# Altium footprint library hphonglib.PcbLib: 703 footprints (part 34 of 44)
Each footprint in its own frame and in the unit in brackets; x right, y up, seen from the top. Pads: shape width x height; smd on the part's side, far side on the other; paste and mask are expansions set on the pad; w line width, h text height; cw(c..) or ccw(c..) is an arc to the next point about the centre after c.
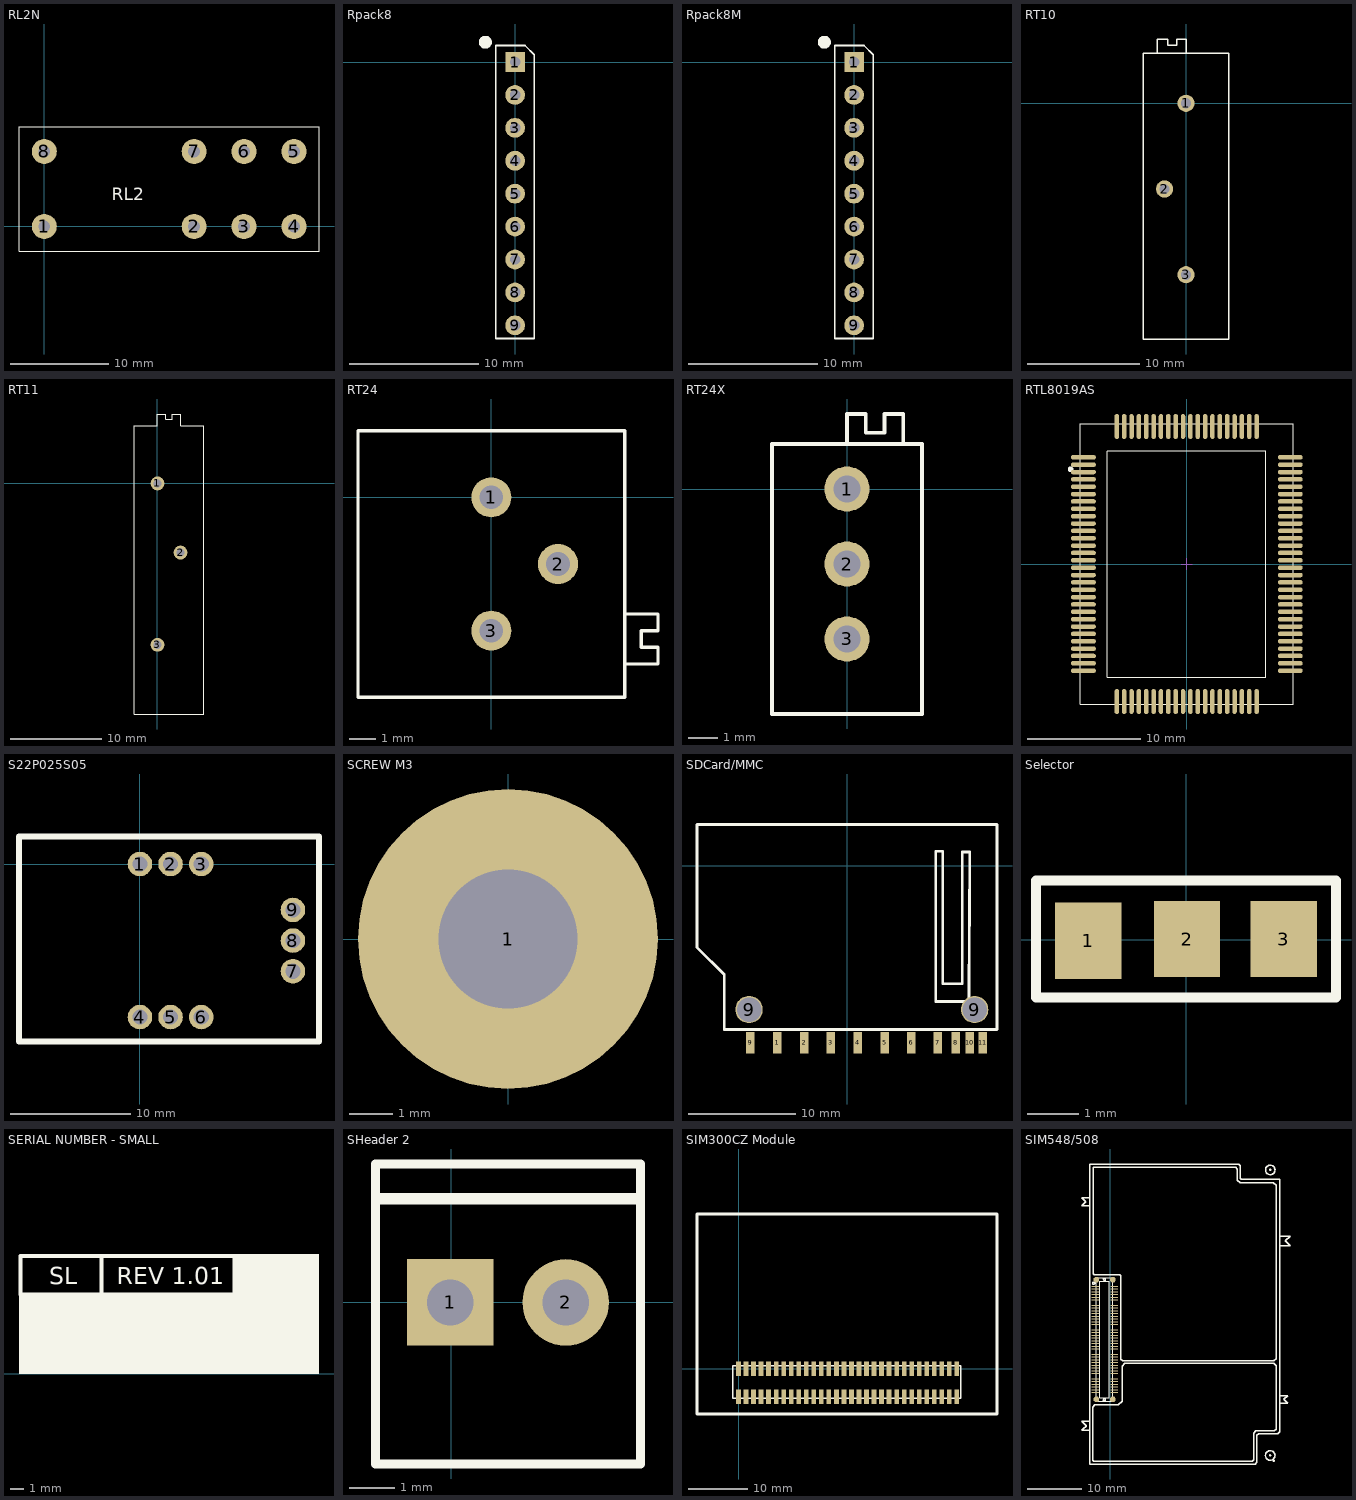
[diagram p33: the footprints below, top view; thin cyan lines are the x and y axes]

## RL2N [mm] "Relè body 29x12mm - 2 way - FEME"
pads (8):
  round 2.54 hole 1.2: 1(0,0) 2(15.24,0) 3(20.32,0) 4(25.4,0) 5(25.4,7.62) 6(20.32,7.62) 7(15.24,7.62) 8(0,7.62)
Top Overlay:
  lines w0.127: -2.54,-2.54 27.94,-2.54 27.94,10.16 -2.54,10.16 -2.54,-2.54
  text "RL2" at 6.858,2.667 h1.27
Bottom Overlay:
  lines w0.254: -2.575,-2.55 -2.575,10.125 27.925,10.125 27.925,-2.55 -2.575,-2.55
3D body: height 20.9, standoff -3.99, extent -1.941,-2.465 27.559,10.035

## Rpack8 [mil]
pads (9):
  rect 60x60 hole 31.5 unplated: 1(0,0)
  round 60 hole 31.5 unplated: 2(0,-100) 3(0,-200) 4(0,-300) 5(0,-400) 6(0,-500) 7(0,-600) 8(0,-700) 9(0,-800)
Top Overlay:
  circle w19.68: c-90.55,60.04 r9.84
  lines w5: -59.06,-840 -59.06,50 30,50 58.07,21.93 58.07,-840 -59.06,-840
Bottom Overlay:
  circle w19.68: c-91.54,57.09 r9.84
  lines w10: -57.09,-841.54 -57.09,50.2 58.07,50.2 58.07,-841.54 -57.09,-841.54
3D body: height 137.8, standoff 0.39, extent -5.25,-10 5,10.09
3D body: height 39.37, standoff 0.39, extent -5.66,-29.53 4.68,29.65
3D body: height 39.37, standoff 0.39, extent -5.66,-129.53 4.68,-70.35
3D body: height 137.8, standoff 0.39, extent -5.25,-110 5,-89.91
3D body: height 39.37, standoff 0.39, extent -5.66,-229.53 4.68,-170.35
3D body: height 137.8, standoff 0.39, extent -5.25,-210 5,-189.91
3D body: height 39.37, standoff 0.39, extent -5.66,-329.53 4.68,-270.35
3D body: height 137.8, standoff 0.39, extent -5.25,-310 5,-289.91
3D body: height 39.37, standoff 0.39, extent -5.66,-429.53 4.68,-370.35
3D body: height 137.8, standoff 0.39, extent -5.25,-410 5,-389.91
3D body: height 39.37, standoff 0.39, extent -5.66,-529.53 4.68,-470.35
3D body: height 137.8, standoff 0.39, extent -5.25,-510 5,-489.91
3D body: height 39.37, standoff 0.39, extent -5.66,-629.53 4.68,-570.35
3D body: height 137.8, standoff 0.39, extent -5.25,-610 5,-589.91
3D body: height 39.37, standoff 0.39, extent -5.66,-729.53 4.68,-670.35
3D body: height 137.8, standoff 0.39, extent -5.25,-710 5,-689.91
3D body: height 39.37, standoff 0.39, extent -5.66,-829.53 4.68,-770.35
3D body: height 137.8, standoff 0.39, extent -5.25,-810 5,-789.91
3D body: height 200.79, standoff 39.37, extent -49.47,-840 48.61,39.62

## Rpack8M [mil]
pads (9):
  rect 60x60 hole 31.5 unplated: 1(0,0)
  round 60 hole 31.5 unplated: 2(0,-100) 3(0,-200) 4(0,-300) 5(0,-400) 6(0,-500) 7(0,-600) 8(0,-700) 9(0,-800)
Top Overlay:
  circle w19.68: c-90.55,60.04 r9.84
  lines w5: -59.06,-840 -59.06,50 30,50 58.07,21.93 58.07,-840 -59.06,-840
Bottom Overlay:
  circle w19.68: c-91.54,57.09 r9.84
  lines w10: -57.09,-841.54 -57.09,50.2 58.07,50.2 58.07,-841.54 -57.09,-841.54
3D body: height 248.03, standoff -86.61, extent -24.61,-844.83 24.61,41

## RT10 [mil]
pads (3):
  round 60 hole 35.43 unplated: 1(0,0) 2(-75,-300) 3(0,-600)
Top Overlay:
  lines w5: -100,175 -100,225 -64,225 -64,203 -32,203 -32,225 0,225 0,175 ; -150,-825 150,-825 150,175 -150,175 -150,-825

## RT11 [mil]
pads (3):
  round 60 hole 35.43 unplated: 1(0,0) 2(100,-300) 3(0,-700)
Top Overlay:
  lines w5: 0,300 0,250 -100,250 -100,-1000 200,-1000 200,250 100,250 100,300 64,300 64,279 36,279 36,301 0,301

## RT24 [mil]
pads (3):
  round 60 hole 35.43 unplated: 1(0,0) 2(100,-100) 3(0,-200)
Top Overlay:
  lines w5: 200,-250 250,-250 250,-225 225,-225 225,-200 250,-200 250,-175 200,-175 ; -200,-300 -200,100 200,100 200,-300 -200,-300

## RT24X [mil]
pads (3):
  round 60 hole 35.43 unplated: 1(0,0) 2(0,-100) 3(0,-200)
Top Overlay:
  lines w5: 0,60 0,100 25,100 25,75 50,75 50,100 75,100 75,60 ; -100,-300 100,-300 100,60 -100,60 -100,-300

## RTL8019AS [mm] "100-Pin Ceramic Quad Flat Pack 0.635 mm Pitch, IPC Medium Density"
height 3.2
pads (100):
  oval 2.2x0.4 smd: 1(-9.125,9.425) 2(-9.125,8.775) 3(-9.125,8.125) 4(-9.125,7.475) 5(-9.125,6.825) 6(-9.125,6.175) 7(-9.125,5.525) 8(-9.125,4.875) 9(-9.125,4.225) 10(-9.125,3.575) 11(-9.125,2.925) 12(-9.125,2.275) 13(-9.125,1.625) 14(-9.125,0.975) 15(-9.125,0.325) 16(-9.125,-0.325) 17(-9.125,-0.975) 18(-9.125,-1.625) 19(-9.125,-2.275) 20(-9.125,-2.925) 21(-9.125,-3.575) 22(-9.125,-4.225) 23(-9.125,-4.875) 24(-9.125,-5.525) 25(-9.125,-6.175) 26(-9.125,-6.825) 27(-9.125,-7.475) 28(-9.125,-8.125) 29(-9.125,-8.775) 30(-9.125,-9.425) 51(9.15,-9.425) 52(9.15,-8.775) 53(9.15,-8.125) 54(9.15,-7.475) 55(9.15,-6.825) 56(9.15,-6.175) 57(9.15,-5.525) 58(9.15,-4.875) 59(9.15,-4.225) 60(9.15,-3.575) 61(9.15,-2.925) 62(9.15,-2.275) 63(9.15,-1.625) 64(9.15,-0.975) 65(9.15,-0.325) 66(9.15,0.325) 67(9.15,0.975) 68(9.15,1.625) 69(9.15,2.275) 70(9.15,2.925) 71(9.15,3.575) 72(9.15,4.225) 73(9.15,4.875) 74(9.15,5.525) 75(9.15,6.175) 76(9.15,6.825) 77(9.15,7.475) 78(9.15,8.125) 79(9.15,8.775) 80(9.15,9.425)
  oval 0.4x2.2 smd: 31(-6.175,-12.15) 32(-5.525,-12.15) 33(-4.875,-12.15) 34(-4.225,-12.15) 35(-3.575,-12.15) 36(-2.925,-12.15) 37(-2.275,-12.15) 38(-1.625,-12.15) 39(-0.975,-12.15) 40(-0.325,-12.15) 41(0.325,-12.15) 42(0.975,-12.15) 43(1.625,-12.15) 44(2.275,-12.15) 45(2.925,-12.15) 46(3.575,-12.15) 47(4.225,-12.15) 48(4.875,-12.15) 49(5.525,-12.15) 50(6.175,-12.15) 81(6.175,12.15) 82(5.525,12.15) 83(4.875,12.15) 84(4.225,12.15) 85(3.575,12.15) 86(2.925,12.15) 87(2.275,12.15) 88(1.625,12.15) 89(0.975,12.15) 90(0.325,12.15) 91(-0.325,12.15) 92(-0.975,12.15) 93(-1.625,12.15) 94(-2.275,12.15) 95(-2.925,12.15) 96(-3.575,12.15) 97(-4.225,12.15) 98(-4.875,12.15) 99(-5.525,12.15) 100(-6.175,12.15)
Top Overlay:
  circle w0.25: c-10.25,8.37 r0.125
  lines w0.1: -7,9.967 -7,-10 7,-10 7,9.967 ; -7,10 7,10 ; -9.4,-12.4 -9.4,12.4 9.4,12.4 9.4,-12.4 -9.4,-12.4
Mechanical 15:
  lines w0.1: -0.5,0 0.5,0 ; 0,-0.5 0,0.5
3D body: height 3, standoff 0, extent -7,-10 7,10

## S22P025S05 [mil] "Tamura"
pads (9):
  round 80 hole 50: 1(0,0) 2(100,0) 3(200,0) 4(0,-500) 5(100,-500) 6(200,-500) 7(500,-350) 8(500,-250) 9(500,-150)
Top Overlay:
  lines w20: 585,85 585,-580 -395,-580 -395,90 585,90

## SCREW M3 [mil] "Hole Screw"
pads (1):
  round 270 hole 125: 1(0,0)

## SDCard/MMC [mil]
pads (13):
  rect 31x79 smd: 1(-256,-650) 2(-157,-650) 3(-59,-650) 4(39,-650) 5(138,-650) 6(236,-650) 7(332,-650) 8(399,-650) 9(-354,-650) 10(450,-650) 11(497,-650)
  round 100 hole 90: 9(-359,-528) 9(468,-528)
Top Overlay:
  lines w10: -548,151 -550,151 ; -550,151 -118,151 550,151 550,-601 -447,-601 -450,-601 -450,-399 -550,-300 -550,151 ; 325,-498 337,-498 447,-498 450,50 423,50 423,-433 351,-433 351,53 325,53 325,-498

## Selector [mm]
pads (3):
  rect 1.3x1.5 smd: 1(-1.921,-0.018) 2(0.021,0.018) 3(1.921,0.018)
Top Overlay:
  lines w0.2: -2.946,1.157 -2.946,-1.132 2.915,-1.132 ; -2.946,1.168 2.94,1.168 ; 2.946,-1.132 2.946,1.168

## SERIAL NUMBER - SMALL [mm]
Top Overlay:
  rectangle: 19.052,-0.01 25.402,9.007
  rectangle: 2.807,-0.01 19.19,6.117
  lines w0.3: 9.019,5.959 9.019,8.88 ; 2.923,5.959 19.052,5.959 19.052,8.88 2.923,8.88 2.923,5.959
  text "REV 1.01" at 10.162,6.721 h1.3
  text "SL" at 5.082,6.721 h1.3

## SHeader 2 [mil] "Connector; Header; Signal; 2 Positions; Solder Pad 35mil"
pads (2):
  rect 75x75 hole 40: 1(-1,0)
  round 75 hole 40: 2(99,0)
Top Overlay:
  lines w7.87: -66,-140 -66,120 164,120 164,-140 -66,-140
  lines w10: -61,90 159,90

## SIM300CZ Module [mm] "GSM Module"
pads (60):
  rect 0.8x2.4 smd: 1(0,-4.7) 2(0,0) 3(1.27,-4.7) 4(1.27,0) 5(2.54,-4.7) 6(2.54,0) 7(3.81,-4.7) 8(3.81,0) 9(5.08,-4.7) 10(5.08,0) 11(6.35,-4.7) 12(6.35,0) 13(7.62,-4.7) 14(7.62,0) 15(8.89,-4.7) 16(8.89,0) 17(10.16,-4.7) 18(10.16,0) 19(11.43,-4.7) 20(11.43,0) 21(12.7,-4.7) 22(12.7,0) 23(13.97,-4.7) 24(13.97,0) 25(15.24,-4.7) 26(15.24,0) 27(16.51,-4.7) 28(16.51,0) 29(17.78,-4.7) 30(17.78,0) 31(19.05,-4.7) 32(19.05,0) 33(20.32,-4.7) 34(20.32,0) 35(21.59,-4.7) 36(21.59,0) 37(22.86,-4.7) 38(22.86,0) 39(24.13,-4.7) 40(24.13,0) 41(25.4,-4.7) 42(25.4,0) 43(26.67,-4.7) 44(26.67,0) 45(27.94,-4.7) 46(27.94,0) 47(29.21,-4.7) 48(29.21,0) 49(30.48,-4.7) 50(30.48,0) 51(31.75,-4.7) 52(31.75,0) 53(33.02,-4.7) 54(33.02,0) 55(34.29,-4.7) 56(34.29,0) 57(35.56,-4.7) 58(35.56,0) 59(36.83,-4.7) 60(36.83,0)
Top Overlay:
  lines w0.254: -1,-5 37.5,-5 37.5,0.5 -1,0.5 -1,-5
  lines w0.508: 5.3,26.1 8.9,26.1 ; 8.9,26.1 43.6,26.1 43.6,-7.6 22.3,-7.6 -1.9,-7.6 -7,-7.6 -7,26.1 8.9,26.1
3D body: height 4.01, standoff 3.9, extent 36.33,-3.762 37.33,-2.7
3D body: height 4.01, standoff 3.9, extent 36.33,-2 37.33,-0.938
3D body: height 4.01, standoff 3.9, extent 35.06,-2 36.06,-0.938
3D body: height 4.01, standoff 3.9, extent 35.06,-3.762 36.06,-2.7
3D body: height 4.01, standoff 3.9, extent 33.79,-2 34.79,-0.938
3D body: height 4.01, standoff 3.9, extent 33.79,-3.762 34.79,-2.7
3D body: height 4.01, standoff 3.9, extent 32.52,-3.762 33.52,-2.7
3D body: height 4.01, standoff 3.9, extent 32.52,-2 33.52,-0.938
3D body: height 4.01, standoff 3.9, extent 31.25,-2 32.25,-0.938
3D body: height 4.01, standoff 3.9, extent 31.25,-3.762 32.25,-2.7
3D body: height 4.01, standoff 3.9, extent 29.98,-2 30.98,-0.938
3D body: height 4.01, standoff 3.9, extent 29.98,-3.762 30.98,-2.7
3D body: height 4.01, standoff 3.9, extent 28.71,-3.762 29.71,-2.7
3D body: height 4.01, standoff 3.9, extent 28.71,-2 29.71,-0.938
3D body: height 4.01, standoff 3.9, extent 27.44,-2 28.44,-0.938
3D body: height 4.01, standoff 3.9, extent 27.44,-3.762 28.44,-2.7
3D body: height 4.01, standoff 3.9, extent 26.17,-2 27.17,-0.938
3D body: height 4.01, standoff 3.9, extent 26.17,-3.762 27.17,-2.7
3D body: height 4.01, standoff 3.9, extent 24.9,-3.762 25.9,-2.7
3D body: height 4.01, standoff 3.9, extent 24.9,-2 25.9,-0.938
3D body: height 4.01, standoff 3.9, extent 23.63,-2 24.63,-0.938
3D body: height 4.01, standoff 3.9, extent 23.63,-3.762 24.63,-2.7
3D body: height 4.01, standoff 3.9, extent 22.36,-2 23.36,-0.938
3D body: height 4.01, standoff 3.9, extent 22.36,-3.762 23.36,-2.7
3D body: height 4.01, standoff 3.9, extent 21.09,-3.762 22.09,-2.7
3D body: height 4.01, standoff 3.9, extent 21.09,-2 22.09,-0.938
3D body: height 4.01, standoff 3.9, extent 19.82,-2 20.82,-0.938
3D body: height 4.01, standoff 3.9, extent 19.82,-3.762 20.82,-2.7
3D body: height 4.01, standoff 3.9, extent 18.55,-2 19.55,-0.938
3D body: height 4.01, standoff 3.9, extent 18.55,-3.762 19.55,-2.7
3D body: height 4.01, standoff 3.9, extent 17.28,-3.762 18.28,-2.7
3D body: height 4.01, standoff 3.9, extent 17.28,-2 18.28,-0.938
3D body: height 4.01, standoff 3.9, extent 16.01,-2 17.01,-0.938
3D body: height 4.01, standoff 3.9, extent 16.01,-3.762 17.01,-2.7
3D body: height 4.01, standoff 3.9, extent 14.74,-2 15.74,-0.938
3D body: height 4.01, standoff 3.9, extent 14.74,-3.762 15.74,-2.7
3D body: height 4.01, standoff 3.9, extent 13.47,-3.762 14.47,-2.7
3D body: height 4.01, standoff 3.9, extent 13.47,-2 14.47,-0.938
3D body: height 4.01, standoff 3.9, extent 12.2,-2 13.2,-0.938
3D body: height 4.01, standoff 3.9, extent 12.2,-3.762 13.2,-2.7
3D body: height 4.01, standoff 3.9, extent 10.93,-2 11.93,-0.938
3D body: height 4.01, standoff 3.9, extent 10.93,-3.762 11.93,-2.7
3D body: height 4.01, standoff 3.9, extent 9.66,-3.762 10.66,-2.7
3D body: height 4.01, standoff 3.9, extent 9.66,-2 10.66,-0.938
3D body: height 4.01, standoff 3.9, extent 8.39,-2 9.39,-0.938
3D body: height 4.01, standoff 3.9, extent 8.39,-3.762 9.39,-2.7
3D body: height 4.01, standoff 3.9, extent 7.12,-2 8.12,-0.938
3D body: height 4.01, standoff 3.9, extent 7.12,-3.762 8.12,-2.7
3D body: height 4.01, standoff 3.9, extent 5.85,-3.762 6.85,-2.7
3D body: height 4.01, standoff 3.9, extent 5.85,-2 6.85,-0.938
3D body: height 4.01, standoff 3.9, extent -0.5,-2 0.5,-0.938
3D body: height 4, standoff 0.1, extent -0.9,-4.975 37.55,0.5
3D body: height 4.01, standoff 3.9, extent -0.5,-3.762 0.5,-2.7
3D body: height 4.01, standoff 3.9, extent 0.77,-3.762 1.77,-2.7
3D body: height 4.01, standoff 3.9, extent 0.77,-2 1.77,-0.938
3D body: height 4.01, standoff 3.9, extent 2.04,-3.762 3.04,-2.7
3D body: height 4.01, standoff 3.9, extent 2.04,-2 3.04,-0.938
3D body: height 4.01, standoff 3.9, extent 3.31,-3.762 4.31,-2.7
3D body: height 4.01, standoff 3.9, extent 3.31,-2 4.31,-0.938
3D body: height 4.01, standoff 3.9, extent 4.58,-3.762 5.58,-2.7
3D body: height 4.01, standoff 3.9, extent 4.58,-2 5.58,-0.938

## SIM548/508 [mm] "SIM508/548-80PIN"
pads (84):
  oct 1x1 smd: 0(-2.5,96) 0(-2.5,118) 0(0.5,96) 0(0.5,118)
  oct 1.4x0.17 smd: 1(-2.75,116.75) 2(0.75,116.75) 3(-2.75,116.25) 4(0.75,116.25) 5(-2.75,115.75) 6(0.75,115.75) 7(-2.75,115.25) 8(0.75,115.25) 9(-2.75,114.75) 10(0.75,114.75) 11(-2.75,114.25) 12(0.75,114.25) 13(-2.75,113.75) 14(0.75,113.75) 15(-2.75,113.25) 16(0.75,113.25) 17(-2.75,112.75) 18(0.75,112.75) 19(-2.75,112.25) 20(0.75,112.25) 21(-2.75,111.75) 22(0.75,111.75) 23(-2.75,111.25) 24(0.75,111.25) 25(-2.75,110.75) 26(0.75,110.75) 27(-2.75,110.25) 28(0.75,110.25) 29(-2.75,109.75) 30(0.75,109.75) 31(-2.75,109.25) 32(0.75,109.25) 33(-2.75,108.75) 34(0.75,108.75) 35(-2.75,108.25) 36(0.75,108.25) 37(-2.75,107.75) 38(0.75,107.75) 39(-2.75,107.25) 40(0.75,107.25) 41(-2.75,106.75) 42(0.75,106.75) 43(-2.75,106.25) 44(0.75,106.25) 45(-2.75,105.75) 46(0.75,105.75) 47(-2.75,105.25) 48(0.75,105.25) 49(-2.75,104.75) 50(0.75,104.75) 51(-2.75,104.25) 52(0.75,104.25) 53(-2.75,103.75) 54(0.75,103.75) 55(-2.75,103.25) 56(0.75,103.25) 57(-2.75,102.75) 58(0.75,102.75) 59(-2.75,102.25) 60(0.75,102.25) 61(-2.75,101.75) 62(0.75,101.75) 63(-2.75,101.25) 64(0.75,101.25) 65(-2.75,100.75) 66(0.75,100.75) 67(-2.75,100.25) 68(0.75,100.25) 69(-2.75,99.75) 70(0.75,99.75) 71(-2.75,99.25) 72(0.75,99.25) 73(-2.75,98.75) 74(0.75,98.75) 75(-2.75,98.25) 76(0.75,98.25) 77(-2.75,97.75) 78(0.75,97.75) 79(-2.75,97.25) 80(0.75,97.25)
Top Overlay:
  circle w0.254: c-3.014,117.35 r0.204
  circle w0.254: c29.424,85.7 r0.876
  circle w0.254: c29.434,138.15 r0.876
  circle w0.254: c29.42,138.21 r0.1
  circle w0.254: c29.4,85.7 r0.1
  circle w0.254: c30.1,84.7 r0.1
  rectangle: -1.25,118 -0.75,118.31
  rectangle: -1.245,95.681 -0.745,96.005
  lines w0.05: -1.25,118.086 -1.25,118.31 ; -1.25,118.105 ccw(c-1,118.105) -0.75,118.105 -0.75,118.3 ; -1.246,95.705 -1.246,95.9 cw(c-0.996,95.9) -0.746,95.9 -0.746,95.676
  lines w0.17: -2.5,95.625 -2.5,118.375 0.5,118.375 0.5,95.625 -2.5,95.625 ; -1.85,96.325 -0.15,96.325 -0.15,117.675 -1.85,117.675 -1.85,96.325
  lines w0.254: -3.72,90.3 -5.2,90.3 -5,90.5 -4.9,90.6 -4.4,91.1 -4.4,91.2 -5.2,92 -3.7,92 ; -3.72,131.6 -5.2,131.6 -4.5,132.3 ; -3.72,133 -5.2,133 -4.5,132.3 ; 2.2,102 2.2,102.1 ; 31.17,95.3 32.6,95.3 31.9,96 ; 31.17,96.7 32.6,96.7 31.9,96 ; 31.17,124.2 33.1,124.2 32.2,125.1 ; 31.17,126 33.1,126 32.2,125.1 ; -4.5,132.3 -4.5,132.3 ; 2.2,102.1 2.7,102.6 30.1,102.6 30.5,102.2 30.5,90.5 30.2,90.2 26.8,90.2 26.4,89.8 26.4,84.9 26.1,84.6 -3,84.6 -3.2,84.8 -3.2,94.6 -2.8,95 1.5,95 2.2,95.7 2.2,102.1 ; 31.9,96 31.9,96 ; 32.2,125.1 32.2,125.1 ; -3.72,84.13 26.63,84.13 26.97,84.47 26.97,89.37 27.3,89.7 30.8,89.7 31.17,90.07 31.17,97.42 31.17,136.4 31.14,136.43 24.13,136.43 23.94,136.62 23.94,137.1 23.94,138.96 23.66,139.24 -3.72,139.24 -3.72,84.13 ; -3.1,119.1 -2.9,118.9 1.8,118.9 2,118.7 2,103.4 2.3,103.1 3,103.1 30.1,103.1 30.5,103.5 30.5,119.7 30.5,135.3 30,135.8 23.9,135.8 23.4,136.3 23.4,138.3 23.1,138.6 -3.1,138.6 -3.1,119.1
3D body: height 1.6, standoff 0, extent -2.575,95.545 0.575,118.46
3D body: height 0, standoff 0, extent -3.222,117.142 -2.807,117.558
3D body: height 1, standoff 0, extent 28.42,137.155 30.43,139.155
3D body: height 1, standoff 0, extent 28.43,84.7 30.44,86.7
3D body: height 1, standoff 0, extent 29.195,137.975 29.655,138.435
3D body: height 1, standoff 0, extent 29.17,85.47 29.63,85.93
3D body: height 1, standoff 0, extent 31.191,124.211 33.068,126.077
3D body: height 1, standoff 0, extent 31.192,95.333 32.554,96.719
3D body: height 1, standoff 0, extent -5.134,90.273 -3.75,92.031
3D body: height 1, standoff 0, extent -5.167,131.572 -3.77,133.027